# Altium footprint library cool_library.PcbLib: 1182 footprints (part 12 of 75)
Each footprint in its own frame and in the unit in brackets; x right, y up, seen from the top. Pads: shape width x height; smd on the part's side, far side on the other; paste and mask are expansions set on the pad; w line width, h text height; cw(c..) or ccw(c..) is an arc to the next point about the centre after c.
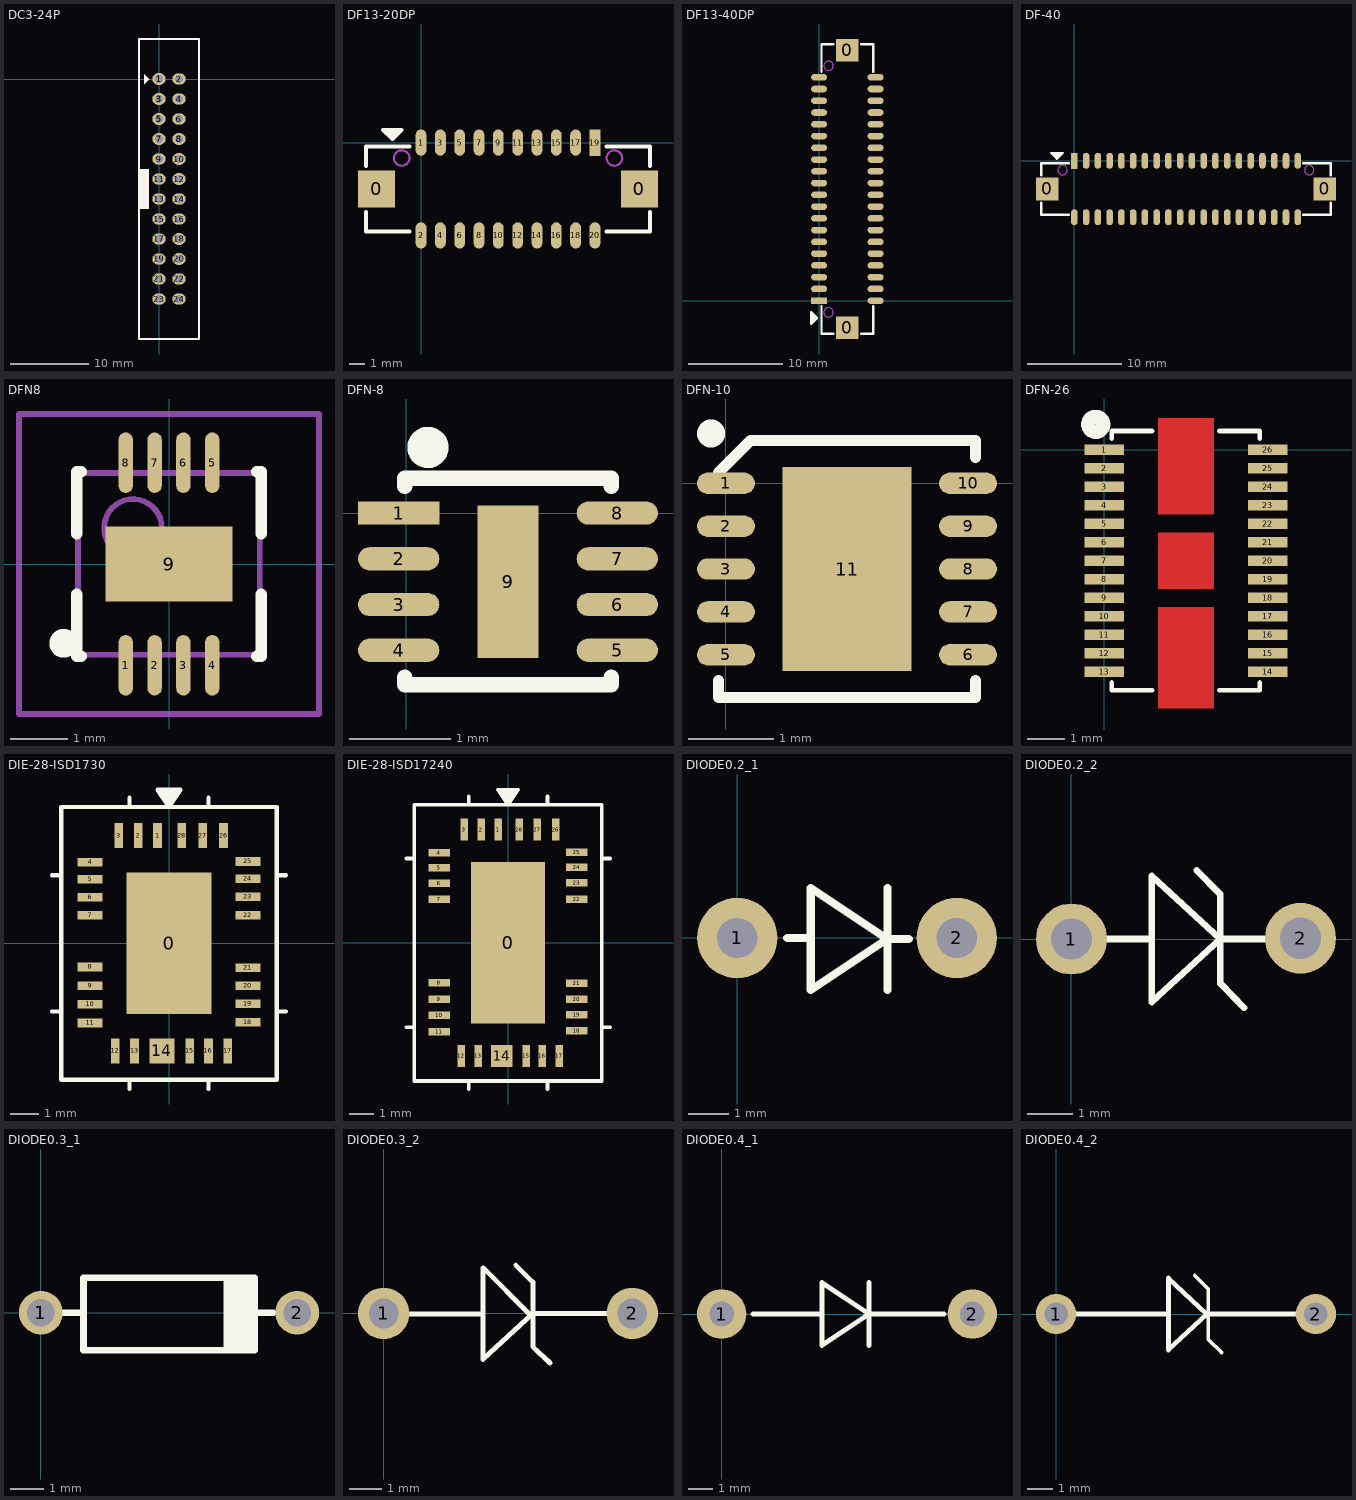
[diagram p11: the footprints below, top view; thin cyan lines are the x and y axes]

## DC3-24P [mm]
height 8.23
pads (24):
  oval 1.7x1.5 hole 1: 1(0,0) 3(0,-2.54) 5(0,-5.08) 7(0,-7.62) 8(2.54,-7.62) 10(2.54,-10.16) 12(2.54,-12.7) 18(2.54,-20.32) 20(2.54,-22.86)
  oval 1.7x1.397 hole 1: 2(2.54,0) 4(2.54,-2.54) 6(2.54,-5.08) 9(0,-10.16) 11(0,-12.7) 13(0,-15.24) 14(2.54,-15.24) 15(0,-17.78) 16(2.54,-17.78) 17(0,-20.32) 19(0,-22.86) 21(0,-25.4) 22(2.54,-25.4) 23(0,-27.94) 24(2.54,-27.94)
Top Overlay:
  rectangle: -2.54,-16.51 -1.27,-11.43
  region: -1.905,0.635 -1.27,0 -1.905,-0.635
  lines w0.2: -2.54,-33.02 -2.54,0 -2.54,2.54 -2.54,5.08 5.08,5.08 5.08,-33.02 -2.54,-33.02

## DF13-20DP [mm]
pads (22):
  rect 2.4x2.4 smd: 0(-2.875,-3) 0(14.125,-3)
  oval 0.7x1.7 smd: 1(0,0) 2(0,-6) 3(1.25,0) 4(1.25,-6) 5(2.5,0) 6(2.5,-6) 7(3.75,0) 8(3.75,-6) 9(5,0) 10(5,-6) 11(6.25,0) 12(6.25,-6) 13(7.5,0) 14(7.5,-6) 15(8.75,0) 16(8.75,-6) 17(10,0) 18(10,-6) 20(11.25,-6)
  rect 0.7x1.7 smd: 19(11.25,0)
Top Overlay:
  rectangle: -2.175,0.37 -1.525,0.825
  lines w0.254: -3.55,-4.476 -3.55,-5.75 -0.737,-5.75 ; -3.55,-1.524 -3.55,-0.25 -0.737,-0.25 ; 11.987,-5.75 14.8,-5.75 14.8,-4.476 ; 11.987,-0.25 14.8,-0.25 14.8,-1.524 ; -2.45,0.825 -1.85,0.225 -1.25,0.825 -2.45,0.825
Keep-Out Layer:
  circle w0.127: c-1.25,-0.997 r0.5
  circle w0.127: c12.5,-0.997 r0.5
Mechanical 1:
  circle w0.127: c-1.25,-0.997 r0.5
  circle w0.127: c12.5,-0.997 r0.5

## DF13-40DP [mm]
pads (42):
  rect 2.4x2.4 smd: 0(3,-2.875) 0(3,26.617)
  rect 1.7x0.7 smd: 1(0,0)
  oval 1.7x0.7 smd: 2(6,0) 3(0,1.25) 4(6,1.25) 5(0,2.5) 6(6,2.5) 7(0,3.75) 8(6,3.75) 9(0,5) 10(6,5) 11(0,6.25) 12(6,6.25) 13(0,7.5) 14(6,7.5) 15(0,8.75) 16(6,8.75) 17(0,10) 18(6,10) 19(0,11.25) 20(6,11.25) 21(0,12.5) 22(6,12.5) 23(0,13.75) 24(6,13.75) 25(0,15) 26(6,15) 27(0,16.25) 28(6,16.25) 29(0,17.5) 30(6,17.5) 31(0,18.75) 32(6,18.75) 33(0,20) 34(6,20) 35(0,21.25) 36(6,21.25) 37(0,22.5) 38(6,22.5) 39(0,23.75) 40(6,23.75)
Top Overlay:
  region: -0.37,-2.175 -0.37,-1.525 -0.825,-1.525 -0.825,-2.175
  lines w0.254: 0.25,-0.613 0.25,-3.51 1.522,-3.51 ; 0.25,24.355 0.25,27.252 1.522,27.252 ; 4.478,-3.51 5.75,-3.51 5.75,-0.613 ; 4.478,27.252 5.75,27.252 5.75,24.355 ; -0.825,-2.45 -0.825,-1.25 -0.225,-1.85 -0.825,-2.45
Keep-Out Layer:
  circle w0.127: c0.997,24.974 r0.5
  circle w0.127: c0.997,-1.25 r0.5
Mechanical 1:
  circle w0.127: c0.997,24.974 r0.5
  circle w0.127: c0.997,-1.25 r0.5

## DF-40 [mm]
pads (42):
  rect 2.4x2.4 smd: 0(-2.875,-3) 0(26.617,-3)
  rect 0.7x1.7 smd: 1(0,0)
  oval 0.7x1.7 smd: 2(0,-6) 3(1.25,0) 4(1.25,-6) 5(2.5,0) 6(2.5,-6) 7(3.75,0) 8(3.75,-6) 9(5,0) 10(5,-6) 11(6.25,0) 12(6.25,-6) 13(7.5,0) 14(7.5,-6) 15(8.75,0) 16(8.75,-6) 17(10,0) 18(10,-6) 19(11.25,0) 20(11.25,-6) 21(12.5,0) 22(12.5,-6) 23(13.75,0) 24(13.75,-6) 25(15,0) 26(15,-6) 27(16.25,0) 28(16.25,-6) 29(17.5,0) 30(17.5,-6) 31(18.75,0) 32(18.75,-6) 33(20,0) 34(20,-6) 35(21.25,0) 36(21.25,-6) 37(22.5,0) 38(22.5,-6) 39(23.75,0) 40(23.75,-6)
Top Overlay:
  rectangle: -2.175,0.37 -1.525,0.825
  lines w0.254: -3.51,-4.478 -3.51,-5.75 -0.613,-5.75 ; -3.51,-1.522 -3.51,-0.25 -0.613,-0.25 ; 24.355,-5.75 27.252,-5.75 27.252,-4.478 ; 24.355,-0.25 27.252,-0.25 27.252,-1.522 ; -2.45,0.825 -1.25,0.825 -1.85,0.225 -2.45,0.825
Keep-Out Layer:
  circle w0.127: c24.974,-0.997 r0.5
  circle w0.127: c-1.25,-0.997 r0.5
Mechanical 1:
  circle w0.127: c24.974,-0.997 r0.5
  circle w0.127: c-1.25,-0.997 r0.5

## DFN8 [mm]
height 1
pads (9):
  oval 0.25x1.05 smd: 1(-0.75,-1.756) 2(-0.25,-1.756) 3(0.25,-1.756) 4(0.75,-1.756) 5(0.75,1.756) 6(0.25,1.756) 7(-0.25,1.756) 8(-0.75,1.756)
  rect 2.2x1.3 smd: 9(0,0)
Top Overlay:
  circle w0.25: c-1.825,-1.375 r0.125
  lines w0.2: -1.6,-0.525 -1.6,-1.6 -1.525,-1.6 ; -1.6,0.525 -1.6,1.6 -1.525,1.6 ; 1.525,-1.6 1.6,-1.6 1.6,-0.525 ; 1.525,1.6 1.6,1.6 1.6,0.525
Mechanical 13:
  circle w0.1: c-0.625,0.625 r0.5
  lines w0.1: -1.575,-1.575 -1.575,1.575 1.575,1.575 1.575,-1.575 -1.575,-1.575
Mechanical 15:
  lines w0.1: -0.5,0 0.5,0 ; 0,-0.5 0,0.5 ; -2.6,-2.6 -2.6,2.6 2.6,2.6 2.6,-2.6 -2.6,-2.6
3D body: height 1, standoff 0.02, extent -1.575,-1.575 1.575,1.575

## DFN-8 [mm]
pads (9):
  rect 0.8x0.229 smd: 1(-0.076,0)
  oval 0.8x0.229 smd: 2(-0.076,-0.45) 3(-0.076,-0.9) 4(-0.076,-1.35) 5(2.076,-1.35) 6(2.076,-0.9) 7(2.076,-0.45) 8(2.076,0)
  rect 0.6x1.5 smd: 9(1,-0.675)
Top Overlay:
  circle w0.203: c0.213,0.646 r0.102
  lines w0.152: -0.016,-1.615 -0.016,-1.691 2.016,-1.691 2.016,-1.615 ; -0.016,0.265 -0.016,0.341 2.016,0.341 2.016,0.265

## DFN-10 [mm]
height 1
pads (11):
  oval 0.675x0.25 smd: 1(0,0) 2(0,-0.5) 3(0,-1) 4(0,-1.5) 5(0,-2) 6(2.825,-2) 7(2.825,-1.5) 8(2.825,-1) 9(2.825,-0.5) 10(2.825,0)
  rect 1.5x2.38 smd: 11(1.412,-1)
Top Overlay:
  circle w0.254: c-0.175,0.582 r0.036
  lines w0.127: -0.088,-2.3 -0.088,-2.5 2.912,-2.5 2.912,-2.3 ; -0.088,0.125 0.288,0.5 2.912,0.5 2.912,0.3

## DFN-26 [mil]
pads (26):
  rect 42x11 smd: 1(0,0) 2(0,-19.68) 3(0,-39.37) 4(0,-59.05) 5(0,-78.74) 6(0,-98.42) 7(0,-118.11) 8(0,-137.79) 9(0,-157.48) 10(0,-177.17) 11(0,-196.85) 12(0,-216.54) 13(0,-236.22) 14(174,-236.22) 15(174,-216.54) 16(174,-196.85) 17(174,-177.17) 18(174,-157.48) 19(174,-137.79) 20(174,-118.11) 21(174,-98.42) 22(174,-78.74) 23(174,-59.05) 24(174,-39.37) 25(174,-19.68) 26(174,0)
Top Layer:
  rectangle: 57,-275 117,-167
  rectangle: 57,-69 117,34
  rectangle: 57,-148.11 117,-88.11
Top Overlay:
  circle w15: c-9,27 r8
  lines w5: 8,-247.59 8,-255.59 51,-255.59 ; 8,12 8,20 51,20 ; 122.48,-255.59 165.48,-255.59 165.48,-247.59 ; 122.48,20 165.48,20 165.48,12
Top Solder:
  rectangle: 54,-281 120,-164
  rectangle: 54,-151 120,-85
  rectangle: 54,-72 120,38

## DIE-28-ISD1730 [mil]
pads (29):
  rect 118.11x196.85 smd: 0(0,0)
  rect 12x35 smd: 1(-16,150) 2(-43,150) 3(-70,150) 12(-75,-150) 13(-48,-150) 15(29,-150) 16(55,-150) 17(82,-150) 26(76,150) 27(47,150) 28(18,150)
  rect 35x12 smd: 4(-110,113) 5(-110,89) 6(-110,64) 7(-110,39) 8(-110,-33) 9(-110,-59) 10(-110,-85) 11(-110,-111) 18(110,-110) 19(110,-84) 20(110,-59) 21(110,-34) 22(110,39) 23(110,65) 24(110,90) 25(110,114)
  rect 35x35 smd: 14(-10,-150)
Top Overlay:
  rectangle: -11,201 11,215
  rectangle: -5,190 5,214
  lines w6: -163,-95 -150,-95 ; -163,95 -150,95 ; -55,-203 -55,-190 ; -55,190 -55,203 ; 55,-203 55,-190 ; 55,190 55,203 ; 150,-95 163,-95 ; 150,95 163,95 ; -150,-190 -150,190 150,190 150,-190 -150,-190 ; -16,214 0,190 16,214 0,214 -16,214
Top Solder:
  rectangle: -132,-172 132,172

## DIE-28-ISD17240 [mil]
pads (29):
  rect 118.11x258 smd: 0(0,0)
  rect 12x35 smd: 1(-16,181) 2(-43,181) 3(-70,181) 12(-75,-181) 13(-48,-181) 15(29,-181) 16(55,-181) 17(82,-181) 26(76,181) 27(47,181) 28(18,181)
  rect 35x12 smd: 4(-110,144) 5(-110,120) 6(-110,95) 7(-110,70) 8(-110,-64) 9(-110,-90) 10(-110,-116) 11(-110,-142) 18(110,-141) 19(110,-115) 20(110,-90) 21(110,-65) 22(110,70) 23(110,96) 24(110,121) 25(110,145)
  rect 35x35 smd: 14(-10,-181)
Top Overlay:
  rectangle: -5,221 5,245
  rectangle: -11,232 11,246
  lines w6: -163,-135 -150,-135 ; -163,135 -150,135 ; -63,-234 -63,-221 ; -63,221 -63,234 ; 63,-234 63,-221 ; 63,221 63,234 ; 150,-135 163,-135 ; 150,135 163,135 ; -150,-221 150,-221 150,221 -150,221 -150,-221 ; -16,245 0,245 16,245 0,221 -16,245
Top Solder:
  rectangle: -132,-203 132,203

## DIODE0.2_1 [mm]
pads (2):
  round 2 hole 1: 1(0,0) 2(5.461,0)
Top Overlay:
  lines w0.203: 1.245,0 1.778,0 ; 3.734,-1.295 3.734,1.245 ; 3.81,-0.025 4.267,-0.025 ; 1.829,-1.295 3.734,-0.025 1.829,1.245 1.829,-1.295

## DIODE0.2_2 [mil]
pads (2):
  round 62 hole 36: 1(0,0) 2(200,0.63)
Top Overlay:
  lines w5.91: 0,0 70,0 ; 70,-55.12 70,0.63 ; 109.33,60 130,39 130,-39 150.67,-60 ; 200,0 130,0 ; 130,0 70,55 70,-55 130,0

## DIODE0.3_1 [mm]
pads (2):
  round 1.3 hole 0.813: 1(0,0) 2(7.62,0)
Top Overlay:
  region: 6.325,1.041 5.436,1.041 5.436,-1.092 6.325,-1.092
  lines w0.203: 0.66,0 1.27,0 ; 1.27,1.016 1.27,0 ; 1.27,1.041 6.35,1.041 6.35,-1.118 1.27,-1.118 1.27,0 ; 6.35,0 6.909,0

## DIODE0.3_2 [mil]
pads (2):
  round 62 hole 36: 1(0,0) 2(300,0)
Top Overlay:
  lines w1.97: 175,0 180,0
  lines w5.91: 0,-0.63 120,-0.63 ; 120,-55.75 120,0 ; 159.33,58.42 180,37.76 180,-40 200.67,-59.69 ; 175,0 120,55 120,-55 180,0 300,0

## DIODE0.4_1 [mm]
pads (2):
  round 2 hole 1: 1(0,0) 2(10.16,0)
Top Overlay:
  lines w0.203: 1.27,0 4.064,0 ; 5.969,-1.27 5.969,1.27 ; 9.017,0 5.969,0 ; 5.969,0 4.064,1.27 4.064,-1.27 5.969,0

## DIODE0.4_2 [mil]
pads (2):
  round 62 hole 36: 1(0,0) 2(400,0)
Top Overlay:
  lines w5.91: 213.58,59.05 234.25,38.39 234.25,-39.37 254.92,-59.05
  lines w7.87: 0,0 170.03,0 ; 231.84,0 400,0 ; 172.79,-55.12 231.84,-0.44 172.79,55.12 172.79,-55.12